# Altium integrated library Silica_IntLib.IntLib: 305 symbols (part 1 of 3) (continued)
## CAP CER 33nF 630V X7R 1206
designator C?, comment 33nF
0.033µF ±10% 630V Ceramic Capacitor X7R 1206 (3216 Metric); Manufacturer 1: TDK Corporation; Part Number 1: C3216X7R2J333K160AA; Supplier 1: Digi-Key; Supplier 2: Digi-Key; Supplier 3: Digi-Key; Supplier 4: Arrow; Supplier 5: Mouser; Supplier 6: RSComponents; Supplier 7: Avnet; Supplier 8: Avnet; Supplier 9: Farnell; Supplier 10: RSComponents; Supplier 11: RSComponents; Supplier 12: Newark; Supplier 13: Newark; Supplier 14: Newark; Supplier 15: RSComponents; Supplier 16: RSComponents; Supplier 17: Arrow; Supplier 18: Future Electronics; Supplier 19: Future Electronics; Supplier Part Number 9: 1844644; Supplier Part Number 8: C3216X7R2J333K160AA; Supplier Part Number 7: 91R0107; Supplier Part Number 6: 740-7644P; Supplier Part Number 5: 810-C3216X7R2J333K; Supplier Part Number 4: C3216X7R2J333K160AA; Supplier Part Number 3: 445-4491-2-ND; Supplier Part Number 2: 445-4491-6-ND; Supplier Part Number 19: C3216X7R2J333K160AA; Supplier Part Number 18: 8024090; Supplier Part Number 17: C3216X7R2J333K160AA**MUL; Supplier Part Number 16: 740-7644; Supplier Part Number 15: 7407644P; Supplier Part Number 14: 91R0107; Supplier Part Number 13: 27AC3698; Supplier Part Number 12: 87R4381; Supplier Part Number 11: 7407644; Supplier Part Number 10: 9213965; Supplier Part Number 1: 445-4491-1-ND; VALUE: 33nF
footprint SMD_1206 (General SMD 1206 footprint)
pins: 1, 2

## CAP CER 33pF 50V C0G/NP0 0603
designator C?, comment 33pF
33pF ±5% 50V Ceramic Capacitor C0G, NP0 0603 (1608 Metric); Manufacturer 1: Murata Electronics North America; MURATA: GRM1885C1H330JA01D; Part Number 1: GRM1885C1H330JA01D
footprint SMD_0603 (General SMD 0603 footprint)
pins: 1, 2

## CAP CER 47nF 50V 0603
designator C?, comment 47nF  (value not drawn)
0.047µF ±10% 50V Ceramic Capacitor X7R 0603 (1608 Metric); Manufacturer 1: TDK Corporation; Part Number 1: CGA3E2X7R1H473K080AD
footprint SMD_0603 (General SMD 0603 footprint)
pins: 1, 2

## CAP CER 47pF 50V C0G/NP0 0603
designator C?, comment 47pF  (value not drawn)
47pF ±5% 50V Ceramic Capacitor C0G, NP0 0603 (1608 Metric); Part Number 1: 06035A470JAT2A; Manufacturer 1: AVX Corporation; TYPE: SMD CAPACITOR; VALUE: 47pF; Supplier 1: Digi-Key; Supplier 2: Digi-Key; Supplier 3: Digi-Key; Supplier 4: Digi-Key; Supplier 5: Digi-Key; Supplier 6: Digi-Key; Supplier 7: Digi-Key; Supplier 8: Digi-Key; Supplier 9: Digi-Key; Supplier Part Number 1: 478-1171-2-ND; Supplier Part Number 2: 478-1171-6-ND; Supplier Part Number 3: 709-1145-6-ND; Supplier Part Number 4: 709-1145-1-ND; Supplier Part Number 5: 709-1145-2-ND; Supplier Part Number 6: 478-1171-1-ND; Supplier Part Number 7: 478-6203-6-ND; Supplier Part Number 8: 478-6203-1-ND; Supplier Part Number 9: 478-6203-2-ND
footprint SMD_0603 (General SMD 0603 footprint)
pins: 1, 2

## CAP CER 47pF 100V C0G/NP0 0603
designator C?, comment 47pF  (value not drawn)
47pF ±10% 100V Ceramic Capacitor C0G, NP0 0603 (1608 Metric); Part Number 1: 06031A470KAT2A; Manufacturer 1: AVX Corporation; VALUE: 47pF
footprint SMD_0603 (General SMD 0603 footprint)
pins: 1, 2

## CAP CER 56pF 100V C0G/NP0 0603
designator C?, comment 56pF
56pF ±5% 100V Ceramic Capacitor C0G, NP0 0603 (1608 Metric); Part Number 1: 06031A560JAT2A; Manufacturer 1: AVX Corporation; VALUE: 56pF; Supplier 1: Digi-Key; Supplier 2: Digi-Key; Supplier 3: Digi-Key; Supplier 4: Future Electronics; Supplier 5: Avnet; Supplier 6: Arrow; Supplier 7: Mouser; Supplier 8: Farnell; Supplier 9: RSComponents; Supplier 10: Newark; Supplier 11: Allied Electronics; Supplier 12: Newark; Supplier 13: RSComponents; Supplier 14: Future Electronics; Supplier 15: Future Electronics; Supplier 16: Future Electronics; Supplier Part Number 1: 478-4993-1-ND; Supplier Part Number 10: 65H7693; Supplier Part Number 11: 70001392; Supplier Part Number 12: 96M1230; Supplier Part Number 13: 888-2046; Supplier Part Number 14: 06031A560JAT2A-REEL; Supplier Part Number 15: 1234939; Supplier Part Number 16: 6999544; Supplier Part Number 2: 478-4993-6-ND; Supplier Part Number 3: 478-4993-2-ND; Supplier Part Number 4: 06031A560JAT2A-CUTT; Supplier Part Number 5: 06031A560JAT2A; Supplier Part Number 9: 8882046; Supplier Part Number 8: 1396454; Supplier Part Number 6: 06031A560JAT2A; Supplier Part Number 7: 581-06031A560J
footprint SMD_0603 (General SMD 0603 footprint)
pins: 1, 2

## CAP CER 100nF 25V X7R 0603
designator C?, comment 100nF
0.1µF ±5% 25V Ceramic Capacitor X7R 0603 (1608 Metric); Part Number 1: C0603C104J3RACTU; Manufacturer 1: KEMET; VALUE: 100nF; Supplier 1: Digi-Key; Supplier 2: Digi-Key; Supplier 3: Digi-Key; Supplier 4: Farnell; Supplier 5: Arrow; Supplier 6: Mouser; Supplier 7: RSComponents; Supplier 8: RSComponents; Supplier 9: Farnell; Supplier 10: Farnell; Supplier 11: Avnet; Supplier 12: RSComponents; Supplier 13: Newark; Supplier 14: Newark; Supplier 15: Newark; Supplier 16: Allied Electronics; Supplier 17: Allied Electronics; Supplier 18: Newark; Supplier 19: Newark; Supplier 20: RSComponents; Supplier 21: RSComponents; Supplier 22: Arrow; Supplier 23: Avnet; Supplier 24: Avnet; Supplier 25: Avnet; Supplier Part Number 1: 399-1282-1-ND; Supplier Part Number 10: 2392300; Supplier Part Number 11: C0603C104J3RACTU; Supplier Part Number 12: 1466422; Supplier Part Number 13: 66W8707; Supplier Part Number 14: 79C3853; Supplier Part Number 15: 01J3308; Supplier Part Number 16: 70096967; Supplier Part Number 17: 70095456; Supplier Part Number 5: C0603C104J3RACTU; Supplier Part Number 4: 1650833; Supplier Part Number 3: 399-1282-2-ND; Supplier Part Number 25: C0603C104J3RAC TU; Supplier Part Number 24: C0603C104J3RAC TU/BKN; Supplier Part Number 23: C0603C104J3RAC>; Supplier Part Number 22: C0603C104J3RACTU**MULT1; Supplier Part Number 21: 801-5237P; Supplier Part Number 20: 801-5237; Supplier Part Number 2: 399-1282-6-ND; Supplier Part Number 19: 36X2612; Supplier Part Number 18: 32X7059; Supplier Part Number 9: 1650833RL; Supplier Part Number 8: 8015237; Supplier Part Number 7: 8015237P; Supplier Part Number 6: 80-C0603C104J3R
footprint SMD_0603 (General SMD 0603 footprint)
pins: 1, 2

## CAP CER 100nF 50V X7R 0603
designator C?, comment 100nF
0.1µF ±20% 50V Ceramic Capacitor X7R 0603 (1608 Metric); Manufacturer 1: AVX Corporation; Part Number 1: 06035C104MAT2A
footprint SMD_0603 (General SMD 0603 footprint)
pins: 1, 2

## CAP CER 100nF 100V X7R 0805
designator C?, comment 100nF
0.1µF ±10% 100V Ceramic Capacitor X7R 0805 (2012 Metric); Manufacturer 1: Murata Electronics North America; MURATA: GCM21BR72A104KA37L; Part Number 1: GCM21BR72A104KA37L
footprint SMD_0805 (Generic 0805 SMD footprint)
pins: 1, 2

## CAP CER 100uF 10V X5R 1206
designator C?, comment 100uF
100µF ±20% 10V Ceramic Capacitor X5R 1206 (3216 Metric); Part Number 1: C3216X5R1A107M160AC; Manufacturer 1: TDK Corporation; VALUE: 100uF
footprint SMD_1206 (General SMD 1206 footprint)
pins: 1, 2

## CAP CER 220nF 25V X7R 0603
designator C?, comment 220nF
0.22µF ±10% 25V Ceramic Capacitor X7R 0603 (1608 Metric); Manufacturer 1: Taiyo Yuden; TAIYO: TMK107B7224KA-T; Part Number 1: TMK107B7224KA-T
footprint SMD_0603 (General SMD 0603 footprint)
pins: 1, 2

## CAP CER 220pF 50V C0G/NP0 0402
designator C?, comment 20pF
220pF ±5% 50V Ceramic Capacitor C0G, NP0 0402 (1005 Metric); Part Number 1: GRM1555C1H221JA01D; Manufacturer 1: Murata Electronics North America; VALUE: 20pF
footprint SMD_0402
pins: 1, 2

## CAP CER 330pF 100V C0G 0603
designator C?, comment 330pF
330pF ±5% 100V Ceramic Capacitor C0G, NP0 0603 (1608 Metric); Part Number 1: C1608C0G2A331J080AA; Manufacturer 1: TDK Corporation; VALUE: 330pF
footprint SMD_0603 (General SMD 0603 footprint)
pins: 1, 2

## CAP CER 470nF 25V X7R 0603
designator C?, comment 470nF
0.47µF ±10% 25V Ceramic Capacitor X7R 0603 (1608 Metric); Manufacturer 1: AVX Corporation; Part Number 1: 06033C474KAT2A; VALUE: 470nF
footprint SMD_0603 (General SMD 0603 footprint)
pins: 1, 2

## CAP CER 470pF 50V C0G/NP0 0603
designator C?, comment 470pF
470pF ±5% 50V Ceramic Capacitor C0G, NP0 0603 (1608 Metric); Part Number 1: GRM1885C1H471JA01D; Manufacturer 1: Murata Electronics North America; VALUE: 470pF
footprint SMD_0603 (General SMD 0603 footprint)
pins: 1, 2

## CAP ELCO 22uF 50V 20% SIZE-D-6MM-ALT
designator C?, comment 22uF
22µF 50V Aluminum Electrolytic Capacitors Radial, Can - SMD  2000 Hrs @ 105°C; Part Number 1: EEE-FK1H220P; Manufacturer 1: Panasonic Electronic Components; VALUE: 22uF
footprint CAPFK Size D (Aluminum Electrolytic Capacitors / Surface Mount Type / Series: FK Type: V)
pins: 1, 2

## CAP ELCO 47U 25V 20% SIZE-D-6MM-ALT
designator C?, comment 47uF
47µF 25V Aluminum Electrolytic Capacitors Radial, Can - SMD  2000 Hrs @ 105°C; Part Number 1: UCL1E470MCL1GS; Manufacturer 1: Nichicon; VALUE: 47uF
footprint CAPFK Size D (Aluminum Electrolytic Capacitors / Surface Mount Type / Series: FK Type: V)
pins: 1, 2

## CAP ELCO 47U 50V 20% SIZE-D-6MM-ALT TR
designator C?, comment 47uF
47µF 50V Aluminum Electrolytic Capacitors Radial, Can - SMD  2000 Hrs @ 85°C; Manufacturer 1: Panasonic Electronic Components; Part Number 1: EEE-1HA470XP; VALUE: 47uF
footprint CAPFK Size D (Aluminum Electrolytic Capacitors / Surface Mount Type / Series: FK Type: V)
pins: 1, 2

## CAP ELCO 47uF 6.3V 20% SIZE-D-6MM-ALT
designator C?, comment 47uF
47µF 6.3V Aluminum Electrolytic Capacitors Radial, Can - SMD  2000 Hrs @ 85°C; Part Number 1: EEE-0JA470SR; Manufacturer 1: Panasonic Electronic Components; VALUE: 47uF
footprint CAPFK Size D (Aluminum Electrolytic Capacitors / Surface Mount Type / Series: FK Type: V)
pins: 1, 2

## CAP ELCO 100uF 16V 20% SIZE-D-6MM-ALT
designator C?, comment 100uF
100µF 16V Aluminum Electrolytic Capacitors Radial, Can - SMD  2000 Hrs @ 105°C; Part Number 1: UUD1C101MCL1GS; Manufacturer 1: Nichicon; VALUE: 100uF
footprint CAPFK Size D (Aluminum Electrolytic Capacitors / Surface Mount Type / Series: FK Type: V)
pins: 1, 2

## CAP GENERICO
designator C?  value 10PF  (hidden comment: *)
TYPE: CAPACITOR
pins: 1, 2

## CAP TANT 10uF 10% 10V 1206
designator C?, comment 10uF
10µF Molded Tantalum Capacitors 10V 1206 (3216 Metric) 3.8Ohm; Part Number 1: T491A106K010AT; Manufacturer 1: KEMET
footprint CAP TANT CASE A - 1206 EIA (KEMET SERIES)
pins: 1, 2

## CAP TANT 10uF 10% 35V 2917
designator C?, comment 10uF
10µF Molded Tantalum Capacitors 35V 2917 (7343 Metric) 800mOhm; Part Number 1: 293D106X9035D2TE3; Manufacturer 1: Vishay Sprague
footprint CAP TANT CASE D - 2917 EIA (AVX SERIES)
pins: 1, 2

## CAP TANT POLY 10uF 35V 1210
designator C?, comment 10uF
10µF Molded Tantalum Polymer Capacitor 35V 1411 (3528 Metric), 1210 200mOhm @ 100kHz; Part Number 1: TCJB106M035R0200; Manufacturer 1: AVX Corporation
footprint RUBS
pins: 1, 2

## CI 74LVC1T45GW 6TSSOP
designator U?, comment 74LVC1T45GW,125
Voltage Level Translator Bidirectional 1 Circuit 1 Channel 420Mbps 6-TSSOP; Manufacturer 1: Nexperia USA Inc.; Manufacturer Part Number 1: 74LVC1T45GW,125
footprint SOT363 (plastic, surface-mounted package; 6 leads; 0.65 mm pitch; 2 mm x 1.25 mm x 0.95 mm body)
pins: 1 VCCA, 2 GND, 3 A, 4 B, 5 DIR, 6 VCCB

## CI ACCEL BMA222 2-16G I2C/SPI LGA12
designator U?, comment BMA222
Accelerometer X, Y, Z Axis ±2g, 4g, 8g, 16g 8Hz ~ 1kHz 12-LGA (2x2); Manufacturer 1: Bosch Sensortec; Value: BMA222; Manufacturer Part Number 1: BMA222
footprint LGA-12-2x2
pins: 1 SDO, 2 SDx, 3 VDDIO, 5 INT1, 6 INT2, 7 VDD, 8 GNDIO, 9 GND, 10 CSB, 11 PS, 12 SCx

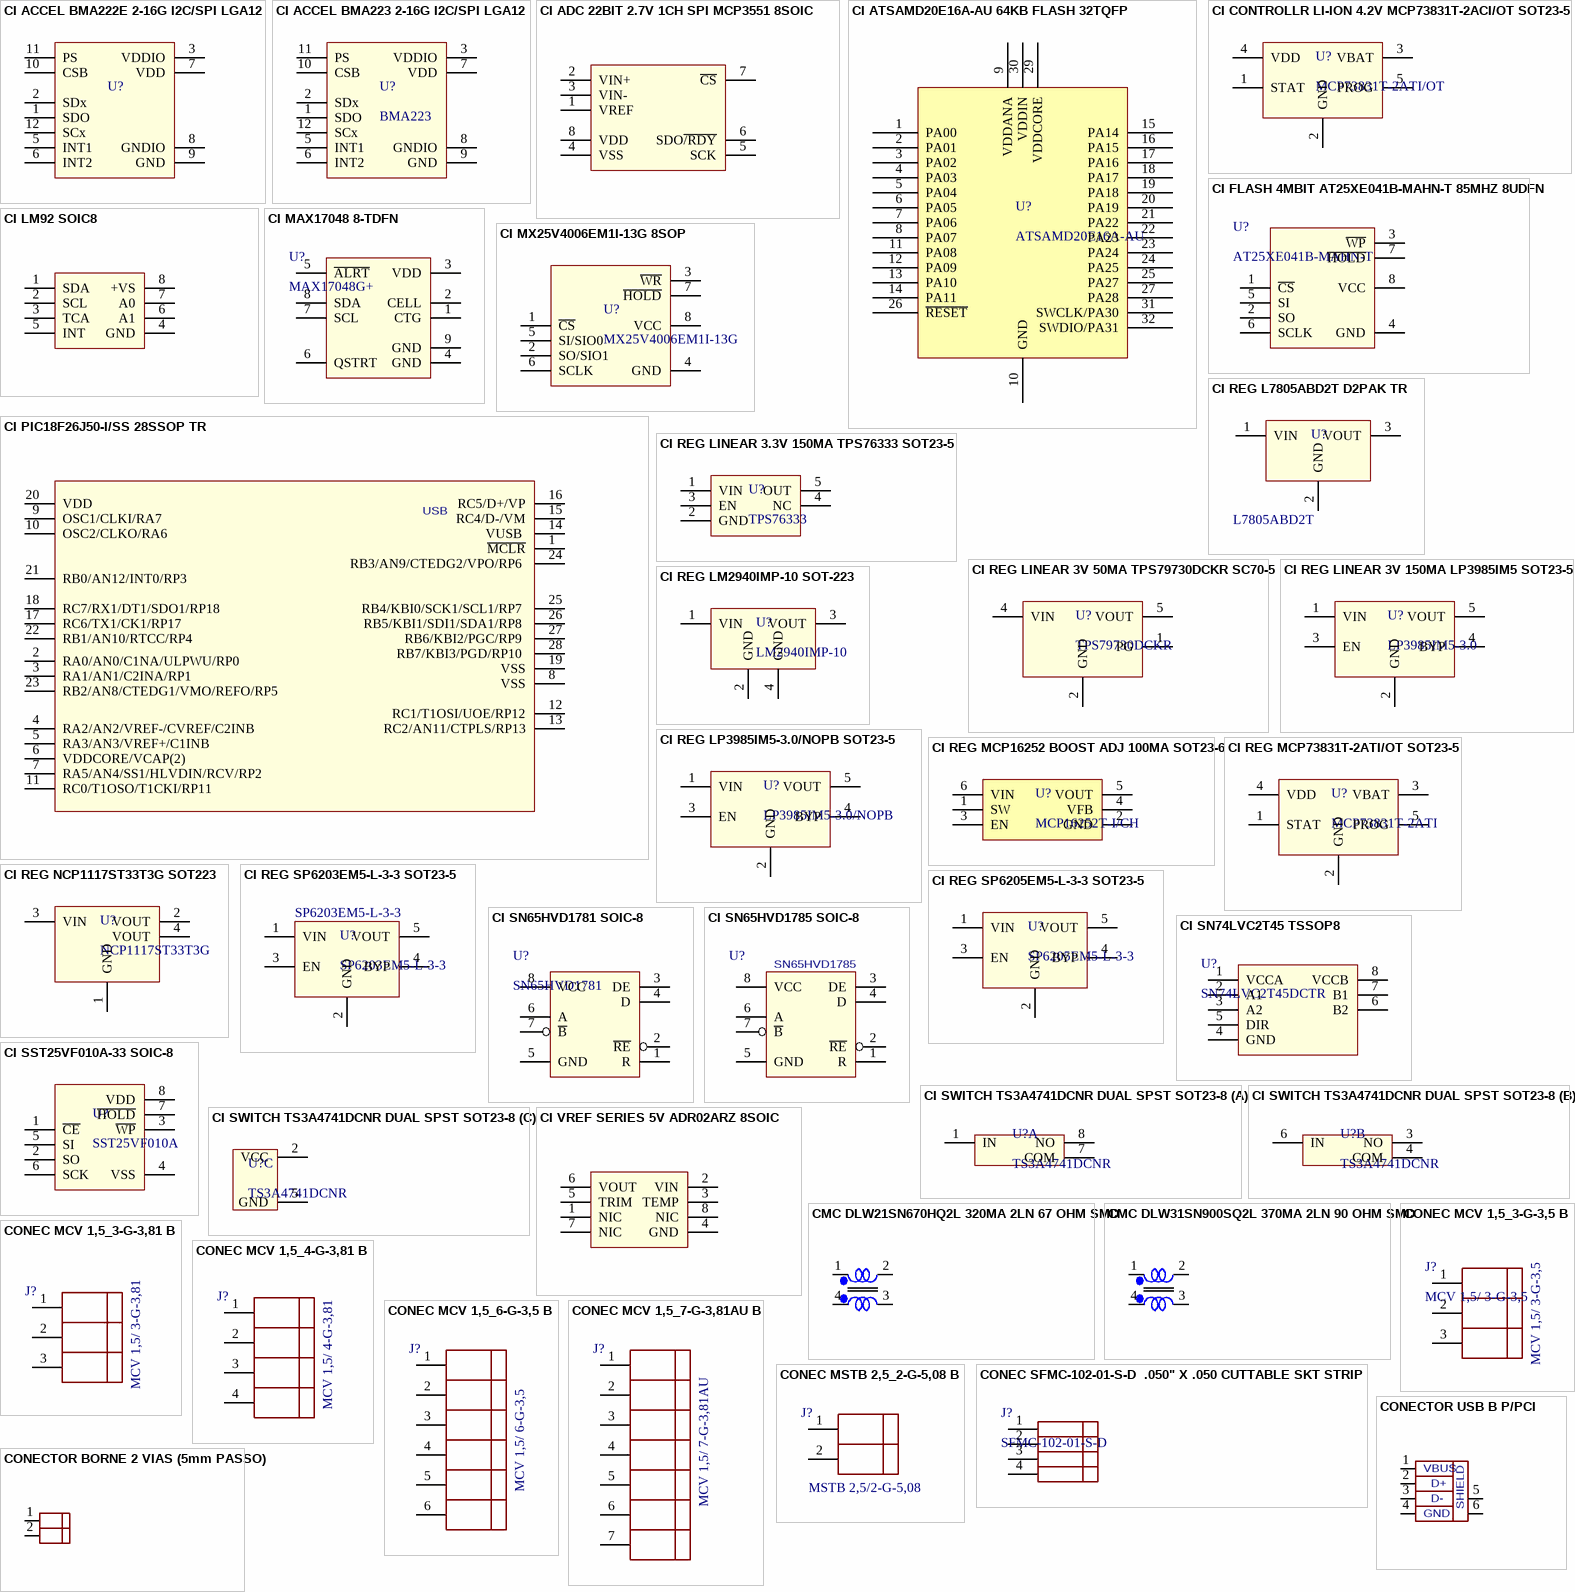
[diagram p2: symbols CI ACCEL BMA222E 2-16G I2C/SPI LGA12 to CONECTOR USB B P/PCI]

## CI ACCEL BMA222E 2-16G I2C/SPI LGA12
designator U?, comment BMA222E  (value not drawn)
Accelerometer X, Y, Z Axis ±2g, 4g, 8g, 16g 8Hz ~ 1kHz 12-LGA (2x2); Manufacturer 1: Bosch Sensortec; Value: BMA222E; Manufacturer Part Number 1: BMA222E
footprint LGA-12-2x2
pins: 1 SDO, 2 SDx, 3 VDDIO, 5 INT1, 6 INT2, 7 VDD, 8 GNDIO, 9 GND, 10 CSB, 11 PS, 12 SCx

## CI ACCEL BMA223 2-16G I2C/SPI LGA12
designator U?, comment BMA223
Accelerometer X, Y, Z Axis ±2g, 4g, 8g, 16g 8Hz ~ 1kHz 12-LGA (2x2); Manufacturer 1: Bosch Sensortec; Value: BMA223; Manufacturer Part Number 1: BMA223
footprint LGA-12-2x2
pins: 1 SDO, 2 SDx, 3 VDDIO, 5 INT1, 6 INT2, 7 VDD, 8 GNDIO, 9 GND, 10 CSB, 11 PS, 12 SCx

## CI ADC 22BIT 2.7V 1CH SPI MCP3551 8SOIC
designator U?, comment MCP3551
22 Bit Analog to Digital Converter 1 Input 1 Sigma-Delta 8-SOIC; Manufacturer 1: Microchip Technology; Part Number 1: MCP3551-E/SN; Supplier 1: Digi-Key; Supplier 2: Future Electronics; Supplier 3: Farnell; Supplier 4: Arrow; Supplier 5: Mouser; Supplier 6: RSComponents; Supplier 7: RSComponents; Supplier 8: Avnet; Supplier 9: Avnet; Supplier 10: RSComponents; Supplier 11: Newark; Supplier 12: Allied Electronics; Supplier 13: Newark; Supplier 14: RSComponents; Supplier 15: RSComponents; Supplier 16: RSComponents; Supplier 17: Future Electronics; Supplier 18: Future Electronics; Supplier Part Number 9: MCP3551-E/SN; Supplier Part Number 8: 22K1369; Supplier Part Number 7: 402-897; Supplier Part Number 6: 402897P; Supplier Part Number 5: 579-MCP3551-E/SN; Supplier Part Number 4: MCP3551-E/SN; Supplier Part Number 3: 1084625; Supplier Part Number 2: MCP3551-E/SN-TUBE; Supplier Part Number 18: 7502412; Supplier Part Number 17: MCP3551-E/SN; Supplier Part Number 16: 402897; Supplier Part Number 15: 402-897P; Supplier Part Number 14: 8767247; Supplier Part Number 13: 97K4494; Supplier Part Number 12: 70046149; Supplier Part Number 11: 22K1369; Supplier Part Number 10: 876-7247; Supplier Part Number 1: MCP3551-E/SN-ND
footprint SOIC-8N
pins: 1 VREF, 2 VIN+, 3 VIN-, 4 VSS, 5 SCK, 6 SDO~{/RDY}, 7 ~{CS}, 8 VDD

## CI ATSAMD20E16A-AU 64KB FLASH 32TQFP
designator U?, comment ATSAMD20E16A-AU
ARM® Cortex®-M0+ SAM D20E Microcontroller IC 32-Bit 48MHz 64KB (64K x 8) FLASH 32-TQFP (7x7); Manufacturer 1: Microchip Technology; Part Number 1: ATSAMD20E16A-AU
footprint TQFP-32_7x7mm_P0.8mm (32-Lead Plastic Thin Quad Flatpack (PT) - 7x7x1.0 mm Body, 2.00 mm [TQFP])
pins: 1 PA00, 2 PA01, 3 PA02, 4 PA03, 5 PA04, 6 PA05, 7 PA06, 8 PA07, 9 VDDANA, 10 GND, 11 PA08, 12 PA09, 13 PA10, 14 PA11, 15 PA14, 16 PA15, 17 PA16, 18 PA17, 19 PA18, 20 PA19, 21 PA22, 22 PA23, 23 PA24, 24 PA25, 25 PA27, 26 ~{RESET}, 27 PA28, 28 GND hidden to GND, 29 VDDCORE, 30 VDDIN, 31 SWCLK/PA30, 32 SWDIO/PA31

## CI CONTROLLR LI-ION 4.2V MCP73831T-2ACI/OT SOT23-5
designator U?, comment MCP73831T-2ATI/OT
Charger IC Lithium-Ion/Polymer SOT-23-5; Manufacturer 1: Microchip Technology; Manufacturer Part Number 1: MCP73831T-2ACI/OT; VALUE: MCP73831T-2ATI/OT; Supplier 1: Newark; Supplier 2: Newark; Supplier 3: RSComponents; Supplier 4: Digi-Key; Supplier 5: RSComponents; Supplier 6: Farnell; Supplier 7: Digi-Key; Supplier 8: RSComponents; Supplier 9: Digi-Key; Supplier 10: RSComponents; Supplier 11: Farnell; Supplier 12: Farnell; Supplier 13: Farnell; Supplier 14: Newark; Supplier Part Number 1: 84R8632; Supplier Part Number 2: 84R5196; Supplier Part Number 3: 738-6617; Supplier Part Number 4: MCP73831T-2ATI/OTTR-ND; Supplier Part Number 5: 738-6617P; Supplier Part Number 6: 1834890; Supplier Part Number 7: MCP73831T-2ATI/OTCT-ND; Supplier Part Number 8: 7386617; Supplier Part Number 9: MCP73831T-2ATI/OTDKR-ND; Supplier Part Number 10: 7386617P; Supplier Part Number 11: 1834890RL; Supplier Part Number 12: 2146142; Supplier Part Number 13: 2413496; Supplier Part Number 14: 56K7047
footprint SOT23-5
pins: 1 STAT, 2 GND, 3 VBAT, 4 VDD, 5 PROG

## CI FLASH 4MBIT AT25XE041B-MAHN-T 85MHZ 8UDFN
designator U?, comment AT25XE041B-MAHN-T
FLASH Memory IC 4Mb (512K x 8) SPI 85MHz  8-UDFN (2x3); Manufacturer 1: Adesto Technologies; Value: AT25XE041B-MAHN-T; Supplier 1: Digi-Key; Supplier 2: Digi-Key; Supplier 3: Digi-Key; Supplier Part Number 1: 1265-1146-6-ND; Supplier Part Number 2: 1265-1146-1-ND; Supplier Part Number 3: 1265-1146-2-ND; Manufacturer Part Number 1: AT25XE041B-MAHN-T
footprint UDFN8 (8-Lead Plastic Dual Flat, No  Lead Package - 2x3x0.5mm Body)
pins: 1 ~{CS}, 2 SO, 3 ~{WP}, 4 GND, 5 SI, 6 SCLK, 7 ~{HOLD}, 8 VCC

## CI LM92 SOIC8
designator U?, comment LM92CIM/NOPB
Temperature Sensor Digital, Local -55°C ~ 150°C 12 b 8-SOIC; Part Number 1: LM92CIMX/NOPB; Manufacturer 1: Texas Instruments; Value: LM92CIM/NOPB; Supplier 1: Newark; Supplier 2: Digi-Key; Supplier 3: Farnell; Supplier 4: Mouser; Supplier Part Number 1: 41K6491; Supplier Part Number 2: LM92CIMX/NOPBTR-ND; Supplier Part Number 3: 1150316; Supplier Part Number 4: 926-LM92CIMX/NOPB
footprint SOIC-8N
pins: 1 SDA, 2 SCL, 3 TCA, 4 GND, 5 INT, 6 A1, 7 A0, 8 +VS

## CI MAX17048 8-TDFN
designator U?, comment MAX17048G+
Battery Battery Monitor IC Lithium-Ion 8-TDFN-EP (2x2); Manufacturer 1: Maxim Integrated; Manufacturer Part Number 1: MAX17048G+T10; Value: MAX17048G+; Supplier 1: Digi-Key; Supplier 2: Digi-Key; Supplier Part Number 1: MAX17048G+T10-ND; Supplier Part Number 2: MAX17048G+-ND
footprint TDFN-8-EP
pins: 1 CTG, 2 CELL, 3 VDD, 4 GND, 5 ~{ALRT}, 6 QSTRT, 7 SCL, 8 SDA, 9 GND

## CI MX25V4006EM1I-13G 8SOP
designator U?, comment MX25V4006EM1I-13G
FLASH - NOR Memory IC 4Mb (512K x 8) SPI 75MHz  8-SOP; Manufacturer 1: Macronix; Value: MX25V4006EM1I-13G; Supplier 1: Digi-Key; Supplier Part Number 1: 1092-1115-ND; Manufacturer Part Number 1: MX25V4006EM1I-13G
footprint SOIC-8N
pins: 1 ~{CS}, 2 SO/SIO1, 3 ~{WR}, 4 GND, 5 SI/SIO0, 6 SCLK, 7 ~{HOLD}, 8 VCC

## CI PIC18F26J50-I/SS 28SSOP TR
designator U?, comment PIC18F26J50-I/SS
28-Pin, Low-Power, High-Performance USB Microcontrollers with nanoWatt XLP Technology; Value: PIC18F26J50-I/SS
footprint SSOP28
pins: 1 ~{MCLR}, 2 RA0/AN0/C1NA/ULPWU/RP0, 3 RA1/AN1/C2INA/RP1, 4 RA2/AN2/VREF-/CVREF/C2INB, 5 RA3/AN3/VREF+/C1INB, 6 VDDCORE/VCAP(2), 7 RA5/AN4/SS1/HLVDIN/RCV/RP2, 8 VSS, 9 OSC1/CLKI/RA7, 10 OSC2/CLKO/RA6, 11 RC0/T1OSO/T1CKI/RP11, 12 RC1/T1OSI/UOE/RP12, 13 RC2/AN11/CTPLS/RP13, 14 VUSB , 15 RC4/D-/VM, 16 RC5/D+/VP, 17 RC6/TX1/CK1/RP17, 18 RC7/RX1/DT1/SDO1/RP18, 19 VSS, 20 VDD , 21 RB0/AN12/INT0/RP3, 22 RB1/AN10/RTCC/RP4 , 23 RB2/AN8/CTEDG1/VMO/REFO/RP5 , 24 RB3/AN9/CTEDG2/VPO/RP6 , 25 RB4/KBI0/SCK1/SCL1/RP7 , 26 RB5/KBI1/SDI1/SDA1/RP8 , 27 RB6/KBI2/PGC/RP9 , 28 RB7/KBI3/PGD/RP10 
text: USB

## CI REG L7805ABD2T D2PAK TR
designator U?, comment L7805ABD2T
Linear Voltage Regulator IC Positive Fixed 1 Output  1.5A D2PAK; Supplier 1: Newark; Supplier 2: Farnell; Supplier 3: Mouser; Supplier 4: Newark; Supplier 5: Digi-Key; Supplier 6: Digi-Key; Supplier Part Number 1: 89K0779; Supplier Part Number 2: 1366571; Supplier Part Number 3: 511-L7805ABD2T-TR; Supplier Part Number 4: 56P8816; Supplier Part Number 5: 497-1170-6-ND; Supplier Part Number 6: 497-1170-1-ND; VALUE: L7805ABD2T
footprint TO-263-3-2
pins: 1 VIN, 2 GND, 3 VOUT

## CI REG LINEAR 3.3V 150MA TPS76333 SOT23-5
designator U?, comment TPS76333
Linear Voltage Regulator IC Positive Fixed 1 Output  150mA SOT-23-5; Manufacturer 1: Texas Instruments; VALUE: TPS76333DBVR; Part Number 1: TPS76333DBVR; Datasheet: http://www.ti.com/lit/ds/symlink/tps763.pdf
footprint SOT23-5
pins: 1 VIN, 2 GND, 3 EN, 4 NC, 5 OUT

## CI REG LINEAR 3V 50MA TPS79730DCKR SC70-5
designator U?, comment TPS79730DCKR
Linear Voltage Regulator IC Positive Fixed 1 Output 3V 50mA SC-70-5; Manufacturer 1: Texas Instruments; VALUE: TPS79730DCKR; Supplier 1: Digi-Key; Supplier 2: Farnell; Supplier 3: Newark; Supplier 4: Newark; Supplier 5: Farnell; Supplier 6: Newark; Supplier 7: Digi-Key; Supplier 8: Farnell; Supplier 9: Newark; Supplier 10: Digi-Key; Supplier 11: Digi-Key; Supplier 12: Newark; Supplier Part Number 1: 296-11989-6-ND; Supplier Part Number 2: 2764765; Supplier Part Number 3: 77C1375; Supplier Part Number 4: 93K0945; Supplier Part Number 5: 1135378; Supplier Part Number 6: 22AC3245; Supplier Part Number 7: 296-11989-1-ND; Supplier Part Number 8: 2437838; Supplier Part Number 9: 58K7017; Supplier Part Number 10: 296-11989-2-ND; Supplier Part Number 11: TPS79730DCKRG4-ND; Supplier Part Number 12: 24K6225; Manufacturer Part Number 1: TPS79730DCKR
footprint SC70-5
pins: 1 PG, 2 GND, 4 VIN, 5 VOUT

## CI REG LINEAR 3V 150MA LP3985IM5 SOT23-5
designator U?, comment LP3985IM5-3.0
Linear Voltage Regulator IC Positive Fixed 1 Output 3V 150mA SOT-23-5; Manufacturer 1: Texas Instruments; VALUE: LP3985IM5-3.0/NOPB; Supplier 1: Newark; Supplier 2: Farnell; Supplier 3: Farnell; Supplier 4: Farnell; Supplier 5: Farnell; Supplier 6: Newark; Supplier 7: Newark; Supplier 8: RSComponents; Supplier 9: RSComponents; Supplier 10: RSComponents; Supplier 11: Digi-Key; Supplier 12: Digi-Key; Supplier 13: Digi-Key; Supplier 14: Digi-Key; Supplier 15: Digi-Key; Supplier 16: RSComponents; Supplier 17: Digi-Key; Supplier Part Number 1: 41K7958; Supplier Part Number 2: 1469153; Supplier Part Number 3: 2412166; Supplier Part Number 4: 1469153RL; Supplier Part Number 5: 2436529; Supplier Part Number 6: 61M7588; Supplier Part Number 7: 28X3622; Supplier Part Number 8: 761-6703; Supplier Part Number 9: 7616703; Supplier Part Number 10: 761-6703P; Supplier Part Number 11: LP3985IM5X-3.0/NOPBCT-ND; Supplier Part Number 12: LP3985IM5X-3.0/NOPBDKR-ND; Supplier Part Number 13: LP3985IM5X-3.0/NOPBTR-ND; Supplier Part Number 14: LP3985IM5-3.0/NOPBDKR-ND; Supplier Part Number 15: LP3985IM5-3.0/NOPBCT-ND; Supplier Part Number 16: 7616703P; Supplier Part Number 17: LP3985IM5-3.0/NOPBTR-ND; Manufacturer Part Number 1: LP3985IM5-3.0/NOPB
footprint SOT23-5
pins: 1 VIN, 2 GND, 3 EN, 4 BYP, 5 VOUT

## CI REG LM2940IMP-10 SOT-223
designator U?, comment LM2940IMP-10
Linear Voltage Regulator IC Positive Fixed 1 Output  1A SOT-223-4; VALUE: LM2940IMP-10/NOPB; Supplier 1: Farnell; Supplier 2: Digi-Key; Supplier 3: Mouser; Supplier 4: Newark; Supplier Part Number 1: 2435949; Supplier Part Number 2: LM2940IMPX-10/NOPB-ND; Supplier Part Number 3: 926-LM2940IMPX10NOPB; Supplier Part Number 4: 87X5582
footprint SOT-223 - 4 (SOT223, 4-Leads, Body 6,7x7,3mm (max), Pitch 2,30mm, IPC High Density)
pins: 1 VIN, 2 GND, 3 VOUT, 4 GND

## CI REG LP3985IM5-3.0/NOPB SOT23-5
designator U?, comment LP3985IM5-3.0/NOPB
Linear Voltage Regulator IC Positive Fixed 1 Output  150mA SOT-23-5; Manufacturer 1: Texas Instruments; VALUE: LP3985IM5-3.0/NOPB; Supplier 1: RSComponents; Supplier 2: Digi-Key; Supplier 3: Farnell; Supplier 4: Farnell; Supplier 5: Digi-Key; Supplier 6: Farnell; Supplier 7: Farnell; Supplier 8: Newark; Supplier 9: Digi-Key; Supplier 10: RSComponents; Supplier 11: RSComponents; Supplier 12: Newark; Supplier 13: RSComponents; Supplier 14: Newark; Supplier Part Number 1: 761-6703P; Supplier Part Number 2: LP3985IM5-3.0/NOPBDKR-ND; Supplier Part Number 3: 1469153; Supplier Part Number 4: 1469153RL; Supplier Part Number 5: LP3985IM5-3.0/NOPBCT-ND; Supplier Part Number 6: 2436529; Supplier Part Number 7: 2412166; Supplier Part Number 8: 61M7588; Supplier Part Number 9: LP3985IM5-3.0/NOPBTR-ND; Supplier Part Number 10: 7616703; Supplier Part Number 11: 761-6703; Supplier Part Number 12: 28X3622; Supplier Part Number 13: 7616703P; Supplier Part Number 14: 41K7958; Manufacturer Part Number 1: LP3985IM5-3.0/NOPB
footprint SOT23-5
pins: 1 VIN, 2 GND, 3 EN, 4 BYP, 5 VOUT
